# Altium footprint library 自建库.PcbLib: 169 footprints (part 5 of 11)
Each footprint in its own frame and in the unit in brackets; x right, y up, seen from the top. Pads: shape width x height; smd on the part's side, far side on the other; paste and mask are expansions set on the pad; w line width, h text height; cw(c..) or ccw(c..) is an arc to the next point about the centre after c.
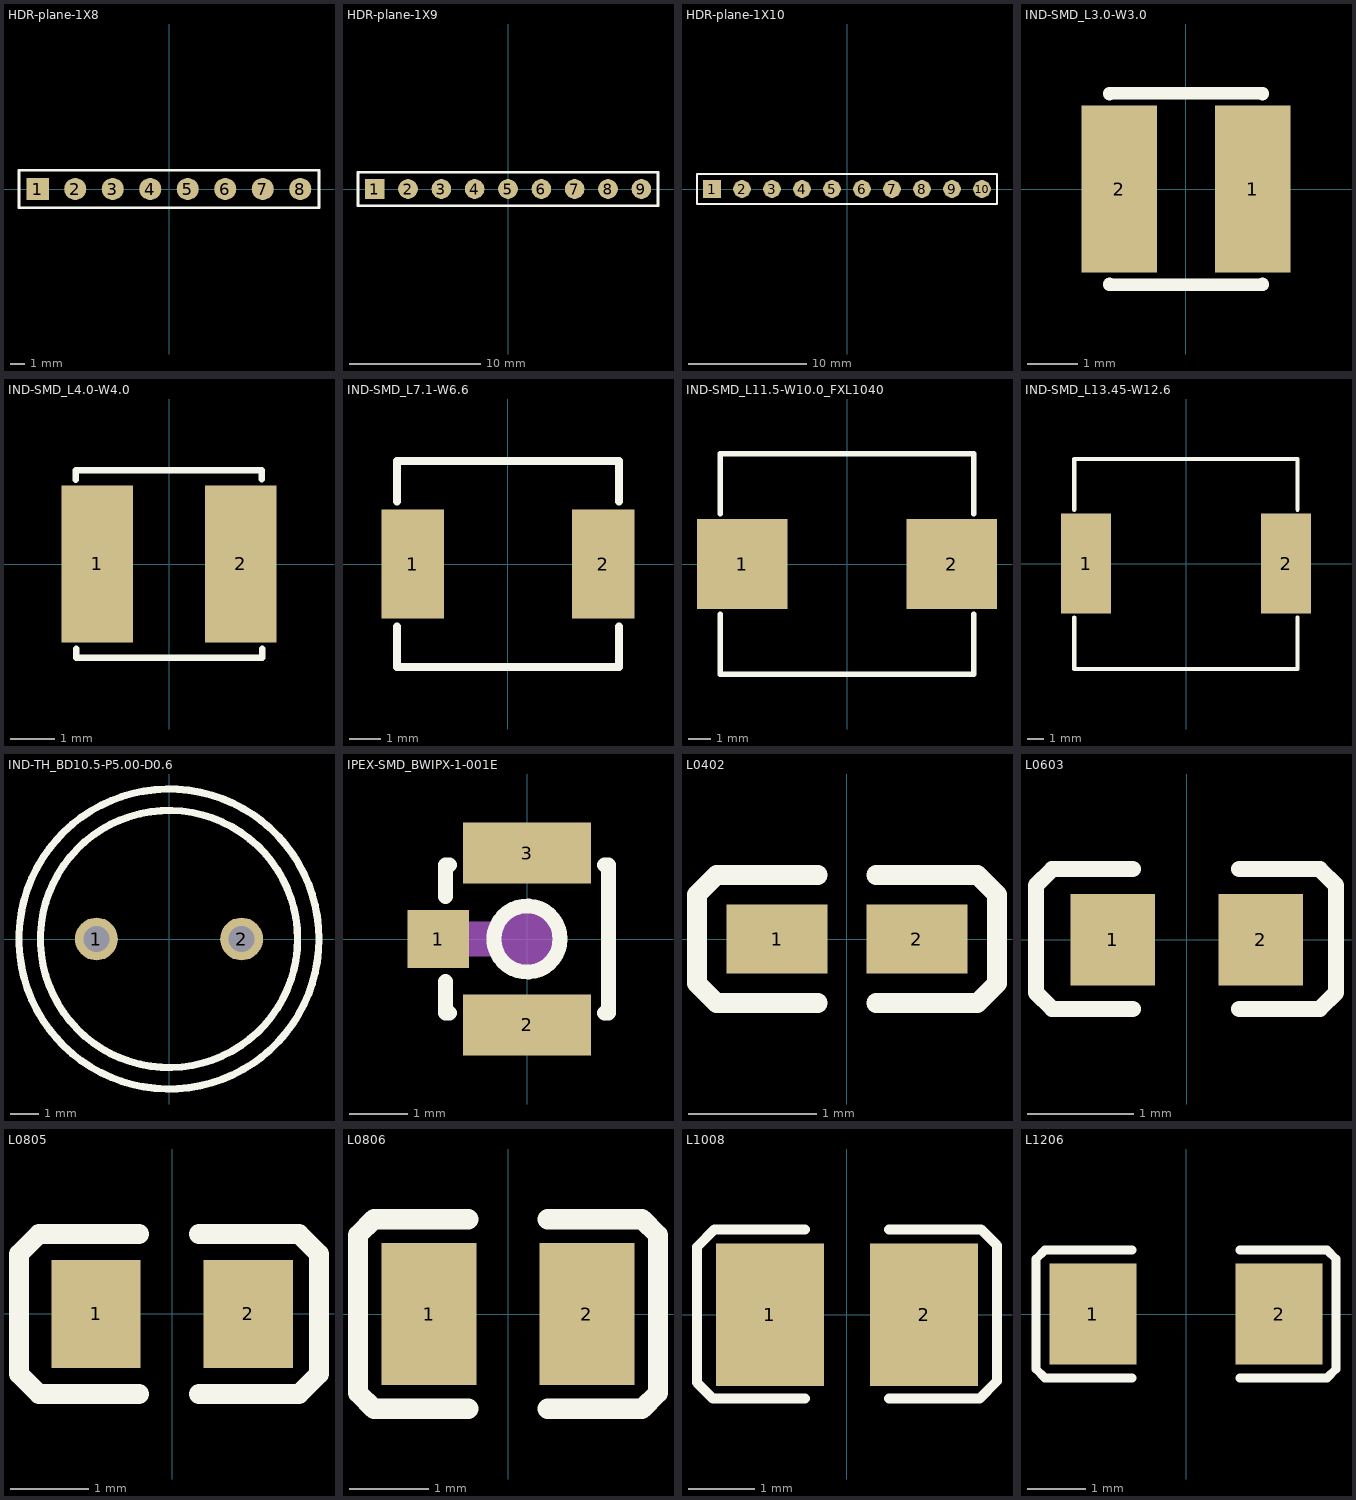
[diagram p4: the footprints below, top view; thin cyan lines are the x and y axes]

## HDR-plane-1X8 [mm] "Connector; Header; 8 Position"
pads (8):
  rect 1.5x1.5 smd: 1(-8.89,0)
  round 1.5 smd: 2(-6.35,0) 3(-3.81,0) 4(-1.27,0) 5(1.27,0) 6(3.81,0) 7(6.35,0) 8(8.89,0)
Top Overlay:
  lines w0.2: -10.16,-1.27 -10.16,1.27 10.16,1.27 10.16,-1.27 -10.16,-1.27

## HDR-plane-1X9 [mm] "Connector; Header; 9 Position"
pads (9):
  rect 1.5x1.5 smd: 1(-10.16,0)
  round 1.5 smd: 2(-7.62,0) 3(-5.08,0) 4(-2.54,0) 5(0,0) 6(2.54,0) 7(5.08,0) 8(7.62,0) 9(10.16,0)
Top Overlay:
  lines w0.2: -11.43,-1.27 -11.43,1.27 11.43,1.27 11.43,-1.27 -11.43,-1.27

## HDR-plane-1X10 [mm] "Connector; Header; 10 Position"
pads (10):
  rect 1.5x1.5 smd: 1(-11.43,0)
  round 1.5 smd: 2(-8.89,0) 3(-6.35,0) 4(-3.81,0) 5(-1.27,0) 6(1.27,0) 7(3.81,0) 8(6.35,0) 9(8.89,0) 10(11.43,0)
Top Overlay:
  lines w0.2: -12.7,-1.27 -12.7,1.27 -10.795,1.27 12.7,1.27 12.7,-1.27 -12.7,-1.27

## IND-SMD_L3.0-W3.0 [mm]
pads (2):
  rect 1.5x3.32 smd: 1(1.328,0) 2(-1.328,0)
Top Overlay:
  lines w0.254: -1.524,-1.891 -1.524,-1.905 1.524,-1.905 1.524,-1.891 ; -1.524,1.891 -1.524,1.905 1.524,1.905 1.524,1.891
3D body "SMD3x3.stp": height 1, standoff 0, extent -1.501,-1.5 1.501,1.5

## IND-SMD_L4.0-W4.0 [mm]
pads (2):
  rect 1.6x3.5 smd: 1(-1.6,0) 2(1.6,0)
Top Overlay:
  lines w0.15: -2.08,1.88 -2.083,2.096 2.07,2.096 2.07,1.9 ; -2.07,-1.89 -2.07,-2.096 2.082,-2.096 2.08,-1.9
3D body "SMD4x4.stp": height 1.8, standoff 0, extent -2.2,-2 2.2,2

## IND-SMD_L7.1-W6.6 [mm]
pads (2):
  rect 2x3.5 smd: 1(-3.05,0) 2(3.05,0)
Top Overlay:
  lines w0.254: -3.55,-2 -3.55,-3.3 3.55,-3.3 3.55,-2 ; -3.55,2 -3.55,3.3 3.55,3.3 3.55,2
3D body "c2983090(1).stp": height 5, standoff 0, extent -3.55,-3.3 3.55,3.3

## IND-SMD_L11.5-W10.0_FXL1040 [mm]
pads (2):
  rect 4.1x4.1 smd: 1(-4.75,0) 2(4.75,0)
Top Overlay:
  lines w0.254: -5.75,-2.281 -5.75,-5 5.75,-5 5.75,-2.281 ; -5.75,2.281 -5.75,5 5.75,5 5.75,2.281
3D body "C428437.stp": height 3.81, standoff 0, extent -5.75,-5 5.75,5

## IND-SMD_L13.45-W12.6 [mm]
pads (2):
  rect 3x6 smd: 1(-6,0) 2(6,0)
Top Overlay:
  lines w0.254: -6.71,-3.231 -6.71,-6.33 6.69,-6.33 6.69,-3.231 ; -6.71,3.231 -6.71,6.25 ; -6.71,6.28 6.69,6.28 6.69,3.231
3D body "C526028.stp": height 4.81, standoff 0, extent -6.725,-6.3 6.725,6.3

## IND-TH_BD10.5-P5.00-D0.6 [mm]
pads (2):
  round 1.5 hole 0.9 paste+0 mask+0.051: 1(-2.54,0) 2(2.54,0)
Top Overlay:
  circle w0.254: c0,0 r5.25
  circle w0.254: c0,0 r4.5
3D body "ind.stp": height 13, standoff -5, extent -5.25,-5.25 5.25,5.25

## IPEX-SMD_BWIPX-1-001E [mm]
pads (3):
  rect 1.05x1 smd: 1(-1.525,0)
  rect 2.2x1.05 smd: 2(0,-1.475) 3(0,1.475)
Top Overlay:
  circle w0.254: c0,0 r0.568
  lines w0.254: -1.398,-0.731 -1.398,-1.27 -1.331,-1.27 ; -1.398,0.731 -1.398,1.27 -1.331,1.27 ; 1.331,-1.27 1.397,-1.27 1.397,-0.731 1.397,0.731 1.397,1.27 1.331,1.27
Mechanical 15:
  circle w0.2: c-1.778,0 r0.1
  region: 0.531,0 0.531,-0.101 0.453,-0.288 0.311,-0.431 0.124,-0.508 0.023,-0.508 -0.036,-0.507 -0.149,-0.478 -0.254,-0.424 -0.343,-0.347 -0.377,-0.3 -1.212,-0.3 -1.212,0.3 -0.377,0.3 -0.343,0.347 -0.254,0.424 -0.149,0.478 -0.036,0.507 0.023,0.508 0.124,0.508 0.311,0.431 0.453,0.288 0.531,0.101 0.531,0
3D body "compound_1.stp": height 1.26, standoff 0, extent -1.55,-1.5 1.55,1.5

## L0402 [mm] "1005"
pads (2):
  rect 0.79x0.54 smd: 1(-0.545,0) 2(0.545,0)
Top Overlay:
  lines w0.152: -0.226,-0.499 -1.016,-0.499 -1.169,-0.346 -1.169,0.346 -1.016,0.499 -0.226,0.499 ; 0.226,-0.499 1.016,-0.499 1.169,-0.346 1.169,0.346 1.016,0.499 0.226,0.499
Top Paste:
  region: 0.135,-0.086 0.135,0.086 0.404,0.27 0.9,0.27 0.94,0.23 0.94,-0.23 0.9,-0.27 0.404,-0.27
  region: -0.135,-0.086 -0.135,0.086 -0.404,0.27 -0.9,0.27 -0.94,0.23 -0.94,-0.23 -0.9,-0.27 -0.404,-0.27
3D body "L0402.stp": height 0.55, standoff 0, extent -0.527,-0.273 0.523,0.277

## L0603 [mm] "C494717-1608"
pads (2):
  rect 0.8x0.864 smd: 1(-0.7,0) 2(0.7,0)
Top Overlay:
  lines w0.152: -0.51,-0.651 -1.272,-0.651 -1.424,-0.499 -1.424,0.517 -1.272,0.67 -0.51,0.67 ; 0.496,-0.651 1.258,-0.651 1.411,-0.499 1.411,0.517 1.258,0.67 0.496,0.67
Top Paste:
  region: 0.264,0.154 0.264,-0.122 0.538,-0.416 1.042,-0.416 1.106,-0.352 1.106,0.384 1.042,0.448 0.538,0.448
  region: -0.252,0.143 -0.252,-0.134 -0.526,-0.427 -1.029,-0.427 -1.093,-0.363 -1.093,0.373 -1.029,0.437 -0.526,0.437
3D body "L0603.stp": height 0.81, standoff 0.01, extent -0.8,-0.4 0.8,0.4

## L0805 [mm] "2012"
pads (2):
  rect 1.133x1.377 smd: 1(-0.966,0) 2(0.966,0)
Top Overlay:
  lines w0.254: -0.421,-1.016 -1.691,-1.016 -1.945,-0.762 -1.945,-0.635 -1.945,0.762 -1.691,1.016 -1.564,1.016 -0.421,1.016 ; 0.341,-1.016 1.484,-1.016 1.611,-1.016 1.865,-0.762 1.865,0.635 1.865,0.762 1.611,1.016 0.341,1.016
Top Paste:
  region: 0.36,-0.22 0.36,0.22 0.745,0.688 1.433,0.688 1.533,0.588 1.533,-0.589 1.433,-0.689 0.745,-0.689
  region: -0.36,-0.22 -0.36,0.22 -0.745,0.688 -1.432,0.688 -1.532,0.588 -1.532,-0.589 -1.432,-0.689 -0.745,-0.689
3D body "L0805.stp": height 1.25, standoff 0, extent -1,-0.625 1,0.625

## L0806 [mm] "2015"
pads (2):
  rect 1.2x1.8 smd: 1(-1,0) 2(1,0)
Top Overlay:
  lines w0.254: -0.5,-1.2 -1.55,-1.2 -1.7,-1.2 -1.9,-1 -1.9,1 -1.7,1.2 -1.55,1.2 -0.5,1.2 ; 0.5,-1.2 1.55,-1.2 1.7,-1.2 1.9,-1 1.9,1 1.7,1.2 1.55,1.2 0.5,1.2
3D body "L0805.stp": height 1.25, standoff 0, extent -1,-0.625 1,0.625

## L1008 [mm]
pads (2):
  rect 1.635x2.16 smd paste-100 mask+0.051: 1(-1.168,0) 2(1.168,0)
Top Overlay:
  lines w0.152: -0.635,-1.27 -2.032,-1.27 -2.273,-1.029 -2.273,1.029 -2.007,1.295 -0.635,1.295 ; 0.635,-1.27 2.007,-1.27 2.273,-1.003 2.273,1.054 2.032,1.295 0.635,1.295
Top Paste:
  region: -0.315,-0.98 -0.315,-0.467 -0.415,-0.367 -0.806,-0.367 -0.906,-0.267 -0.906,0.267 -0.806,0.367 -0.415,0.367 -0.315,0.467 -0.315,0.98 -0.415,1.08 -1.885,1.08 -1.985,0.98 -1.985,-0.98 -1.885,-1.08 -0.415,-1.08
  region: 0.315,-0.98 0.315,-0.467 0.415,-0.367 0.806,-0.367 0.906,-0.267 0.906,0.267 0.806,0.367 0.415,0.367 0.315,0.467 0.315,0.98 0.415,1.08 1.885,1.08 1.985,0.98 1.985,-0.98 1.885,-1.08 0.415,-1.08
3D body "compound_1_2_3.stp": height 1.5, standoff 0, extent -1.25,-1.01 1.25,1

## L1206 [mm] "3216"
pads (2):
  rect 1.485x1.728 smd: 1(-1.593,0) 2(1.593,0)
Top Overlay:
  lines w0.152: -0.926,-1.093 -2.411,-1.093 -2.564,-0.94 -2.564,0.94 -2.411,1.093 -0.926,1.093 ; 0.926,-1.093 2.411,-1.093 2.564,-0.94 2.564,0.94 2.411,1.093 0.926,1.093
Top Paste:
  region: 0.85,-0.764 0.85,-0.394 0.95,-0.294 1.255,-0.294 1.355,-0.194 1.355,0.194 1.255,0.294 0.95,0.294 0.85,0.394 0.85,0.764 0.95,0.864 2.235,0.864 2.335,0.764 2.335,-0.764 2.235,-0.864 0.95,-0.864
  region: -0.85,-0.764 -0.85,-0.394 -0.95,-0.294 -1.255,-0.294 -1.355,-0.194 -1.355,0.194 -1.255,0.294 -0.95,0.294 -0.85,0.394 -0.85,0.764 -0.95,0.864 -2.235,0.864 -2.335,0.764 -2.335,-0.764 -2.235,-0.864 -0.95,-0.864
3D body "L1206.stp": height 1.1, standoff 0, extent -1.6,-0.798 1.6,0.798